# Altium footprint library RES_TH.PcbLib: 104 footprints (part 3 of 7)
Each footprint in its own frame and in the unit in brackets; x right, y up, seen from the top. Pads: shape width x height; smd on the part's side, far side on the other; paste and mask are expansions set on the pad; w line width, h text height; cw(c..) or ccw(c..) is an arc to the next point about the centre after c.
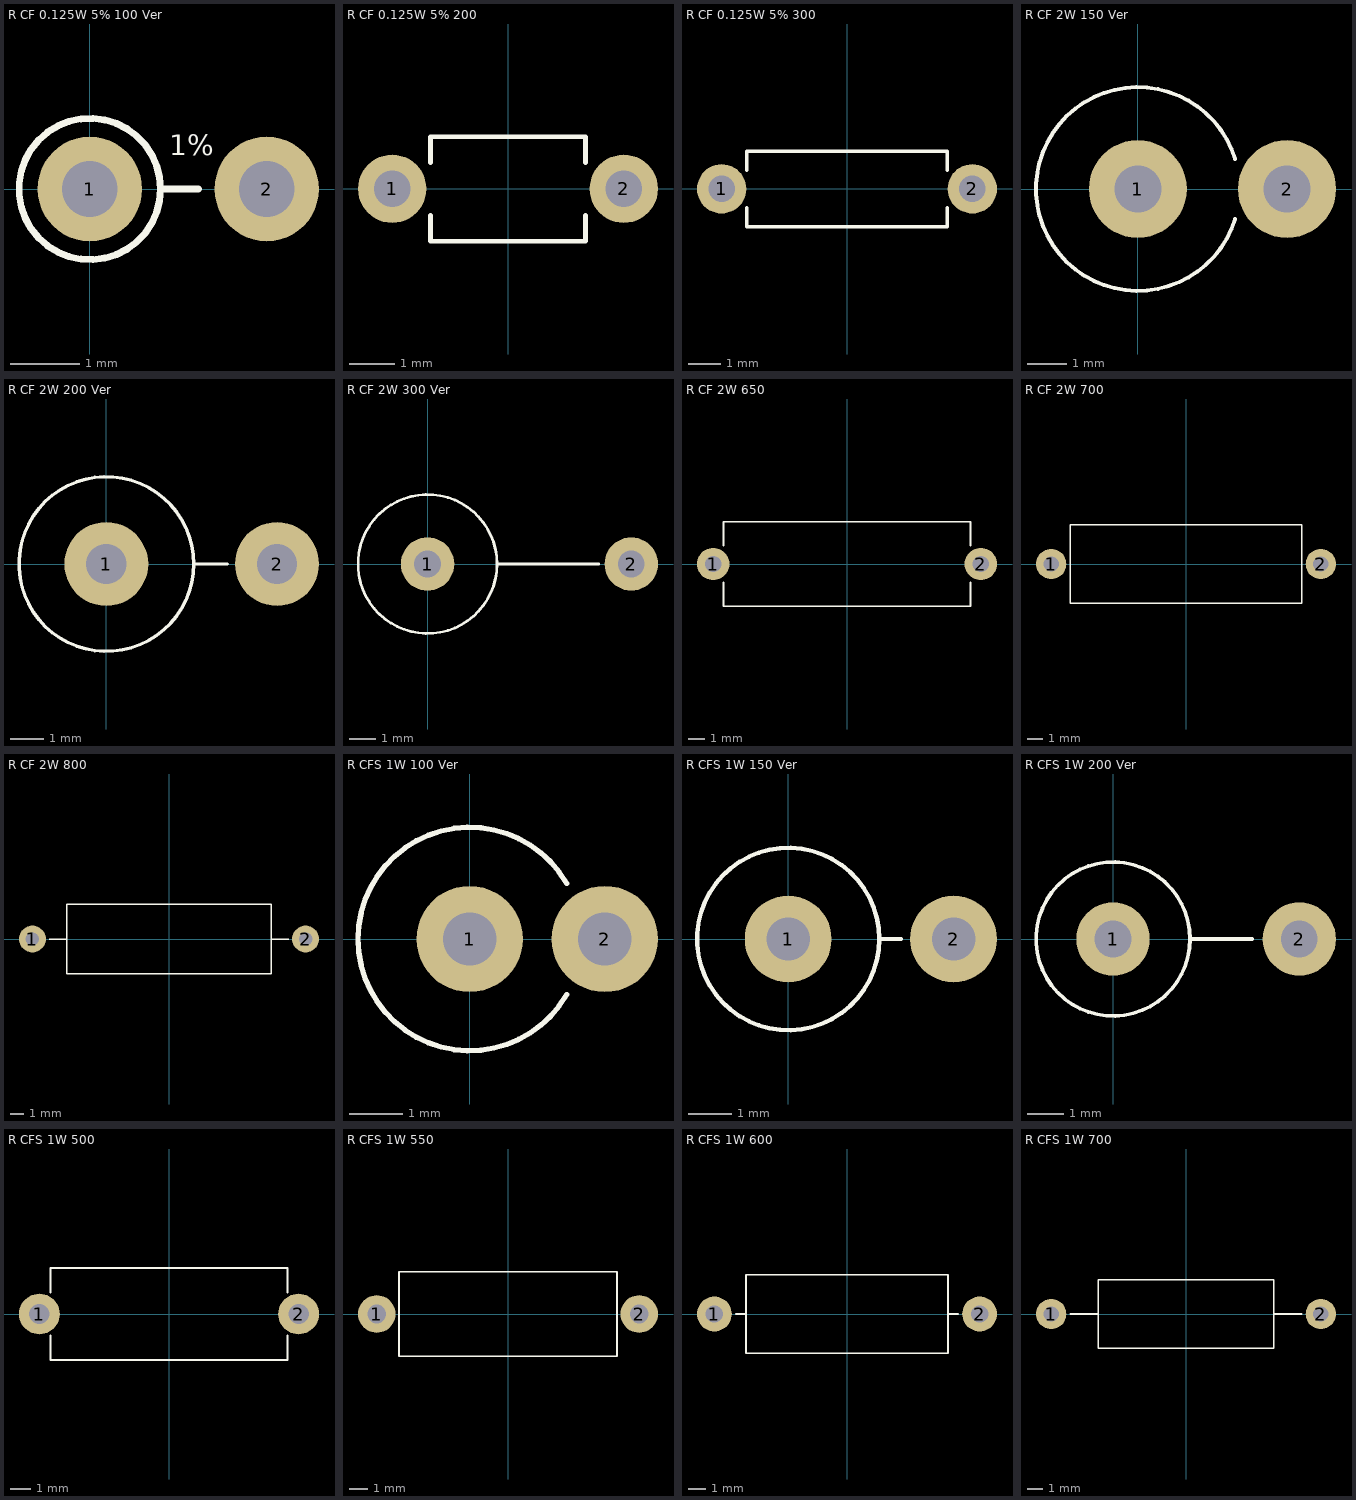
[diagram p2: the footprints below, top view; thin cyan lines are the x and y axes]

## R CF 0.125W 5% 100 Ver [mm]
pads (2):
  round 1.5 hole 0.8: 1(0,0) 2(2.54,0)
Top Overlay:
  circle w0.1: c0,0 r1.016
  lines w0.1: 1.016,0 1.562,0
  text "1%" at 1.143,0.381 h0.5
3D body "R0.125W 5% 100 Ver.STEP": height 6.07, standoff -2.54, extent -1.15,-1.15 2.84,1.15

## R CF 0.125W 5% 200 [mm]
pads (2):
  round 1.5 hole 0.8: 1(-2.54,0) 2(2.54,0)
Top Overlay:
  lines w0.1: -1.7,-0.577 -1.7,-1.15 1.7,-1.15 1.7,-0.577 ; -1.7,0.568 -1.7,1.141 1.7,1.141 1.7,0.568
3D body "R0.125W 5% 200.SLDPRT": height 2.3, standoff -2.5, extent -2.839,-1.15 2.839,1.15

## R CF 0.125W 5% 300 [mm]
pads (2):
  round 1.5 hole 0.8: 1(-3.81,0) 2(3.81,0)
Top Overlay:
  lines w0.1: -3.048,-0.577 -3.048,-1.15 3.048,-1.15 3.048,-0.577 ; -3.048,0.568 -3.048,1.141 3.048,1.141 3.048,0.568
3D body "R0.125W 5% 300.SLDPRT": height 2.3, standoff -2.5, extent -4.11,-1.15 4.11,1.15

## R CF 2W 150 Ver [mm]
pads (2):
  round 2.5 hole 1.2: 1(0,0) 2(3.81,0)
Top Overlay:
  lines w0.1: 2.485,-0.765 cw(c0,0) 2.485,0.765
3D body "R2W CFS 150 Ver.SLDPRT": height 18.81, standoff -2.03, extent -2.613,-2.613 4.207,2.613

## R CF 2W 200 Ver [mm]
pads (2):
  round 2.5 hole 1.2: 1(0,0) 2(5.08,0)
Top Overlay:
  circle w0.1: c0,0 r2.6
  lines w0.1: 2.6,0 3.6,0
3D body "R2W CFS 200 Ver.SLDPRT": height 19.44, standoff -2.03, extent -2.613,-2.613 5.477,2.613

## R CF 2W 300 Ver [mm]
pads (2):
  round 2 hole 1: 1(0,0) 2(7.62,0)
Top Overlay:
  circle w0.1: c0,0 r2.6
  lines w0.1: 2.6,0 6.4,0
3D body "R2W CFS 300 Ver.SLDPRT": height 20.71, standoff -2.03, extent -2.613,-2.613 8.017,2.613

## R CF 2W 650 [mm]
pads (2):
  round 2 hole 1: 1(-8.255,0) 2(8.255,0)
Top Overlay:
  lines w0.1: -7.62,-1.12 -7.62,-2.6 7.62,-2.6 7.62,-1.12 ; -7.62,1.12 -7.62,2.6 7.62,2.6 7.62,1.12
3D body "R2W CFS 650.SLDPRT": height 5.2, standoff -2.54, extent -8.605,-2.6 8.605,2.6

## R CF 2W 700 [mm]
pads (2):
  round 2 hole 1: 1(-8.89,0) 2(8.89,0)
Top Overlay:
  lines w0.1: -7.62,-2.6 7.62,-2.6 7.62,2.6 -7.62,2.6 -7.62,-2.6
3D body "R2W CFS 700.SLDPRT": height 5.2, standoff -2.54, extent -9.24,-2.6 9.24,2.6

## R CF 2W 800 [mm]
pads (2):
  round 2 hole 1: 1(-10.16,0) 2(10.16,0)
Top Overlay:
  lines w0.1: -8.9,0 -7.62,0 ; 7.62,0 8.9,0 ; -7.62,-2.6 7.62,-2.6 7.62,2.6 -7.62,2.6 -7.62,-2.6
3D body "R2W CFS 800.SLDPRT": height 5.2, standoff -2.54, extent -10.51,-2.6 10.51,2.6

## R CFS 1W 100 Ver [mm]
pads (2):
  round 2 hole 1: 1(0,0) 2(2.54,0)
Top Overlay:
  lines w0.1: 1.823,-1.042 cw(c0,0) 1.823,1.042
3D body "R1W CFS 100 Ver.STEP": height 14.08, standoff -2.03, extent -2.1,-2.1 2.84,2.1

## R CFS 1W 150 Ver [mm]
pads (2):
  round 2 hole 1: 1(0,0) 2(3.81,0)
Top Overlay:
  circle w0.1: c0,0 r2.1
  lines w0.1: 2.159,0 2.6,0
3D body "R1W CFS 150 Ver.STEP": height 14.71, standoff -2.03, extent -2.1,-2.1 4.11,2.1

## R CFS 1W 200 Ver [mm]
pads (2):
  round 2 hole 1: 1(0,0) 2(5.08,0)
Top Overlay:
  circle w0.1: c0,0 r2.1
  lines w0.1: 2.159,0 3.8,0
3D body "R1W CFS 200 Ver.STEP": height 15.35, standoff -2.03, extent -2.1,-2.1 5.38,2.1

## R CFS 1W 500 [mm]
pads (2):
  round 2 hole 1: 1(-6.35,0) 2(6.35,0)
Top Overlay:
  lines w0.1: -5.8,-1.05 -5.8,-2.25 5.8,-2.25 5.8,-1.05 ; -5.8,1.05 -5.8,2.25 5.8,2.25 5.8,1.05
3D body "R1W CFS 500.SLDPRT": height 4.5, standoff -2.54, extent -6.648,-2.25 6.648,2.25

## R CFS 1W 550 [mm]
pads (2):
  round 2 hole 1: 1(-6.985,0) 2(6.985,0)
Top Overlay:
  lines w0.1: -5.8,-2.25 5.8,-2.25 5.8,2.25 -5.8,2.25 -5.8,-2.25
3D body "R1W CFS 550.SLDPRT": height 4.5, standoff -2.54, extent -7.283,-2.25 7.283,2.25

## R CFS 1W 600 [mm]
pads (2):
  round 2 hole 1: 1(-7.62,0) 2(7.62,0)
Top Overlay:
  lines w0.1: -6.4,0 -5.8,0 ; 5.8,0 6.4,0 ; -5.8,-2.25 5.8,-2.25 5.8,2.25 -5.8,2.25 -5.8,-2.25
3D body "R1W CFS 600.SLDPRT": height 4.5, standoff -2.54, extent -7.918,-2.25 7.918,2.25

## R CFS 1W 700 [mm]
pads (2):
  round 2 hole 1: 1(-8.89,0) 2(8.89,0)
Top Overlay:
  lines w0.1: -7.62,0 -5.8,0 ; 5.8,0 7.62,0 ; -5.8,-2.25 -5.8,2.25 5.8,2.25 5.8,-2.25 -5.8,-2.25
3D body "R1W CFS 700.SLDPRT": height 4.5, standoff -2.54, extent -9.188,-2.25 9.188,2.25